# Altium integrated library BS_Altium_Lib.IntLib: 1016 symbols (part 7 of 8) (continued)
## LQG15HS39NJ02D (continued)
FIXED IND 39NH 300MA 650 MOHM; Manufacturer: Murata Electronics North America; Manufacturer Part Number: LQG15HS39NJ02D; Type: Multilayer; Tolerance: ±5%; Shielding: Unshielded; DC Resistance (DCR): 650 mOhm Max; Q @ Freq: 8 @ 100MHz; Frequency - Self Resonant: 1.2GHz; Frequency - Test: 100MHz; Supplier 1: Digi-Key; RoHS: RoHS Compliant; Category: Inductors, Coils, Chokes; Stock 1: 53048; Pricing 1: 1=0.1, 10=0.064, 25=0.0576, 50=0.05, 100=0.0448, 250=0.0416, 500=0.0384, 750=0.03648, 1000=0.03328 (USD); Packaging: Cut Tape (CT); Part Status: Active; Material - Core: -; Inductance: 39nH; Current Rating: 300mA; Current - Saturation: -; Ratings: -; Operating Temperature: -55°C ~ 125°C; Mounting Type: Surface Mount; Supplier Device Package: 0402 (1005 Metric); Size / Dimension: 0.039" L x 0.020" W (1.00mm x 0.50mm); Height - Seated (Max): 0.022" (0.55mm); ComponentLink1URL: http://psearch.en.murata.com/inductor/product/LQG15HS39NJ02_.pdf; ComponentLink1Description: http://psearch.en.murata.com/inductor/product/LQG15HS39NJ02_.pdf; Supplier Part Number 1: 490-2630-1-ND
footprint L 0402 (1005) (Chip Capacitor, 2-Leads, Body 1.0x0.5mm, IPC Medium Density)
pins: 1, 2

## LQG15HS47NJ02D
designator L?, comment 47nH  Package / Case: 0402
FIXED IND 47NH 300MA 720 MOHM; Manufacturer: Murata Electronics North America; Manufacturer Part Number: LQG15HS47NJ02D; Type: Multilayer; Tolerance: ±5%; Shielding: Unshielded; DC Resistance (DCR): 720 mOhm Max; Q @ Freq: 8 @ 100MHz; Frequency - Self Resonant: 1GHz; Frequency - Test: 100MHz; Supplier 1: Digi-Key; RoHS: RoHS Compliant; Category: Inductors, Coils, Chokes; Stock 1: 32519; Pricing 1: 1=0.1, 10=0.064, 25=0.0576, 50=0.05, 100=0.0448, 250=0.0416, 500=0.0384, 750=0.03648, 1000=0.03328 (USD); Packaging: Cut Tape (CT); Part Status: Active; Material - Core: -; Inductance: 47nH; Current Rating: 300mA; Current - Saturation: -; Ratings: -; Operating Temperature: -55°C ~ 125°C; Mounting Type: Surface Mount; Supplier Device Package: 0402 (1005 Metric); Size / Dimension: 0.039" L x 0.020" W (1.00mm x 0.50mm); Height - Seated (Max): 0.022" (0.55mm); ComponentLink1URL: http://psearch.en.murata.com/inductor/product/LQG15HS47NJ02_.pdf; ComponentLink1Description: http://psearch.en.murata.com/inductor/product/LQG15HS47NJ02_.pdf; Supplier Part Number 1: 490-2631-1-ND
footprint L 0402 (1005) (Chip Capacitor, 2-Leads, Body 1.0x0.5mm, IPC Medium Density)
pins: 1, 2

## LQG15HS56NJ02D
designator L?, comment 56nH  Package / Case: 0402
FIXED IND 56NH 250MA 820 MOHM; Manufacturer: Murata Electronics North America; Manufacturer Part Number: LQG15HS56NJ02D; Type: Multilayer; Tolerance: ±5%; Shielding: Unshielded; DC Resistance (DCR): 820 mOhm Max; Q @ Freq: 8 @ 100MHz; Frequency - Self Resonant: 800MHz; Frequency - Test: 100MHz; Supplier 1: Digi-Key; RoHS: RoHS Compliant; Category: Inductors, Coils, Chokes; Stock 1: 19955; Pricing 1: 1=0.1, 10=0.064, 25=0.0576, 50=0.05, 100=0.0448, 250=0.0416, 500=0.0384, 750=0.03648, 1000=0.03328 (USD); Packaging: Cut Tape (CT); Part Status: Active; Material - Core: -; Inductance: 56nH; Current Rating: 250mA; Current - Saturation: -; Ratings: -; Operating Temperature: -55°C ~ 125°C; Mounting Type: Surface Mount; Supplier Device Package: 0402 (1005 Metric); Size / Dimension: 0.039" L x 0.020" W (1.00mm x 0.50mm); Height - Seated (Max): 0.022" (0.55mm); ComponentLink1URL: http://psearch.en.murata.com/inductor/product/LQG15HS56NJ02_.pdf; ComponentLink1Description: http://psearch.en.murata.com/inductor/product/LQG15HS56NJ02_.pdf; Supplier Part Number 1: 490-2632-1-ND
footprint L 0402 (1005) (Chip Capacitor, 2-Leads, Body 1.0x0.5mm, IPC Medium Density)
pins: 1, 2

## LQG15HS68NJ02D
designator L?, comment 68nH  Package / Case: 0402
FIXED IND 68NH 250MA 920 MOHM; Manufacturer: Murata Electronics North America; Manufacturer Part Number: LQG15HS68NJ02D; Type: Multilayer; Tolerance: ±5%; Shielding: Unshielded; DC Resistance (DCR): 920 mOhm Max; Q @ Freq: 8 @ 100MHz; Frequency - Self Resonant: 800MHz; Frequency - Test: 100MHz; Supplier 1: Digi-Key; RoHS: RoHS Compliant; Category: Inductors, Coils, Chokes; Stock 1: 24528; Pricing 1: 1=0.1, 10=0.064, 25=0.0576, 50=0.05, 100=0.0448, 250=0.0416, 500=0.0384, 750=0.03648, 1000=0.03328 (USD); Packaging: Cut Tape (CT); Part Status: Active; Material - Core: -; Inductance: 68nH; Current Rating: 250mA; Current - Saturation: -; Ratings: -; Operating Temperature: -55°C ~ 125°C; Mounting Type: Surface Mount; Supplier Device Package: 0402 (1005 Metric); Size / Dimension: 0.039" L x 0.020" W (1.00mm x 0.50mm); Height - Seated (Max): 0.022" (0.55mm); ComponentLink1URL: http://psearch.en.murata.com/inductor/product/LQG15HS68NJ02_.pdf; ComponentLink1Description: http://psearch.en.murata.com/inductor/product/LQG15HS68NJ02_.pdf; Supplier Part Number 1: 490-2633-1-ND
footprint L 0402 (1005) (Chip Capacitor, 2-Leads, Body 1.0x0.5mm, IPC Medium Density)
pins: 1, 2

## LQG15HS82NJ02D
designator L?, comment 82nH  Package / Case: 0402
FIXED IND 82NH 200MA 1.2 OHM SMD; Manufacturer: Murata Electronics North America; Manufacturer Part Number: LQG15HS82NJ02D; Type: Multilayer; Tolerance: ±5%; Shielding: Unshielded; DC Resistance (DCR): 1.2 Ohm Max; Q @ Freq: 8 @ 100MHz; Frequency - Self Resonant: 700MHz; Frequency - Test: 100MHz; Supplier 1: Digi-Key; RoHS: RoHS Compliant; Category: Inductors, Coils, Chokes; Stock 1: 21756; Pricing 1: 1=0.1, 10=0.069, 25=0.062, 50=0.0538, 100=0.0483, 250=0.04484, 500=0.0414, 750=0.03933, 1000=0.03588 (USD); Packaging: Cut Tape (CT); Part Status: Active; Material - Core: -; Inductance: 82nH; Current Rating: 200mA; Current - Saturation: -; Ratings: -; Operating Temperature: -55°C ~ 125°C; Mounting Type: Surface Mount; Supplier Device Package: 0402 (1005 Metric); Size / Dimension: 0.039" L x 0.020" W (1.00mm x 0.50mm); Height - Seated (Max): 0.022" (0.55mm); ComponentLink1URL: http://psearch.en.murata.com/inductor/product/LQG15HS82NJ02_.pdf; ComponentLink1Description: http://psearch.en.murata.com/inductor/product/LQG15HS82NJ02_.pdf; Supplier Part Number 1: 490-2634-1-ND
footprint L 0402 (1005) (Chip Capacitor, 2-Leads, Body 1.0x0.5mm, IPC Medium Density)
pins: 1, 2

## LQG15HSR10J02D
designator L?, comment 100nH  Package / Case: 0402
FIXED IND 100NH 200MA 1.25 OHM; Manufacturer: Murata Electronics North America; Manufacturer Part Number: LQG15HSR10J02D; Type: Multilayer; Tolerance: ±5%; Shielding: Unshielded; DC Resistance (DCR): 1.25 Ohm Max; Q @ Freq: 8 @ 100MHz; Frequency - Self Resonant: 600MHz; Frequency - Test: 100MHz; Supplier 1: Digi-Key; RoHS: RoHS Compliant; Category: Inductors, Coils, Chokes; Stock 1: 87967; Pricing 1: 1=0.1, 10=0.069, 25=0.062, 50=0.0538, 100=0.0483, 250=0.04484, 500=0.0414, 750=0.03933, 1000=0.03588 (USD); Packaging: Cut Tape (CT); Part Status: Active; Material - Core: -; Inductance: 100nH; Current Rating: 200mA; Current - Saturation: -; Ratings: -; Operating Temperature: -55°C ~ 125°C; Mounting Type: Surface Mount; Supplier Device Package: 0402 (1005 Metric); Size / Dimension: 0.039" L x 0.020" W (1.00mm x 0.50mm); Height - Seated (Max): 0.022" (0.55mm); ComponentLink1URL: http://psearch.en.murata.com/inductor/product/LQG15HSR10J02_.pdf; ComponentLink1Description: http://psearch.en.murata.com/inductor/product/LQG15HSR10J02_.pdf; Supplier Part Number 1: 490-2635-1-ND
footprint L 0402 (1005) (Chip Capacitor, 2-Leads, Body 1.0x0.5mm, IPC Medium Density)
pins: 1, 2

## LQG15HSR12J02D
designator L?, comment 120nH  Package / Case: 0402
FIXED IND 120NH 200MA 1.3 OHM; Manufacturer: Murata Electronics North America; Manufacturer Part Number: LQG15HSR12J02D; Type: Multilayer; Tolerance: ±5%; Shielding: Unshielded; DC Resistance (DCR): 1.3 Ohm Max; Q @ Freq: 8 @ 100MHz; Frequency - Self Resonant: 600MHz; Frequency - Test: 100MHz; Supplier 1: Digi-Key; RoHS: RoHS Compliant; Category: Inductors, Coils, Chokes; Stock 1: 20627; Pricing 1: 1=0.1, 10=0.069, 25=0.062, 50=0.0538, 100=0.0483, 250=0.04484, 500=0.0414, 750=0.03933, 1000=0.03588 (USD); Packaging: Cut Tape (CT); Part Status: Active; Material - Core: -; Inductance: 120nH; Current Rating: 200mA; Current - Saturation: -; Ratings: -; Operating Temperature: -55°C ~ 125°C; Mounting Type: Surface Mount; Supplier Device Package: 0402 (1005 Metric); Size / Dimension: 0.039" L x 0.020" W (1.00mm x 0.50mm); Height - Seated (Max): 0.022" (0.55mm); ComponentLink1URL: http://psearch.en.murata.com/inductor/product/LQG15HSR12J02_.pdf; ComponentLink1Description: http://psearch.en.murata.com/inductor/product/LQG15HSR12J02_.pdf; Supplier Part Number 1: 490-2636-1-ND
footprint L 0402 (1005) (Chip Capacitor, 2-Leads, Body 1.0x0.5mm, IPC Medium Density)
pins: 1, 2

## LQG15HSR15J02D
designator L?, comment 150nH  Package / Case: 0402
FIXED IND 150NH 150MA 2.99 OHM; Manufacturer: Murata Electronics North America; Manufacturer Part Number: LQG15HSR15J02D; Type: Multilayer; Tolerance: ±5%; Shielding: Unshielded; DC Resistance (DCR): 2.99 Ohm Max; Q @ Freq: 8 @ 100MHz; Frequency - Self Resonant: 550MHz; Frequency - Test: 100MHz; Supplier 1: Digi-Key; RoHS: RoHS Compliant; Category: Inductors, Coils, Chokes; Stock 1: 32667; Pricing 1: 1=0.1, 10=0.076, 25=0.068, 50=0.0588, 100=0.0529, 250=0.04908, 500=0.0453, 750=0.04304, 1000=0.03926 (USD); Packaging: Cut Tape (CT); Part Status: Active; Material - Core: -; Inductance: 150nH; Current Rating: 150mA; Current - Saturation: -; Ratings: -; Operating Temperature: -55°C ~ 125°C; Mounting Type: Surface Mount; Supplier Device Package: 0402 (1005 Metric); Size / Dimension: 0.039" L x 0.020" W (1.00mm x 0.50mm); Height - Seated (Max): 0.022" (0.55mm); ComponentLink1URL: http://psearch.en.murata.com/inductor/product/LQG15HSR15J02_.pdf; ComponentLink1Description: http://psearch.en.murata.com/inductor/product/LQG15HSR15J02_.pdf; Supplier Part Number 1: 490-2637-1-ND
footprint L 0402 (1005) (Chip Capacitor, 2-Leads, Body 1.0x0.5mm, IPC Medium Density)
pins: 1, 2

## LQG15HSR18J02D
designator L?, comment 180nH  Package / Case: 0402
FIXED IND 180NH 150MA 3.38 OHM; Manufacturer: Murata Electronics North America; Manufacturer Part Number: LQG15HSR18J02D; Type: Multilayer; Tolerance: ±5%; Shielding: Unshielded; DC Resistance (DCR): 3.38 Ohm Max; Q @ Freq: 8 @ 100MHz; Frequency - Self Resonant: 500MHz; Frequency - Test: 100MHz; Supplier 1: Digi-Key; RoHS: RoHS Compliant; Category: Inductors, Coils, Chokes; Stock 1: 5742; Pricing 1: 1=0.1, 10=0.076, 25=0.068, 50=0.0588, 100=0.0529, 250=0.04908, 500=0.0453, 750=0.04304, 1000=0.03926 (USD); Packaging: Cut Tape (CT); Part Status: Active; Material - Core: -; Inductance: 180nH; Current Rating: 150mA; Current - Saturation: -; Ratings: -; Operating Temperature: -55°C ~ 125°C; Mounting Type: Surface Mount; Supplier Device Package: 0402 (1005 Metric); Size / Dimension: 0.039" L x 0.020" W (1.00mm x 0.50mm); Height - Seated (Max): 0.022" (0.55mm); ComponentLink1URL: http://psearch.en.murata.com/inductor/product/LQG15HSR18J02_.pdf; ComponentLink1Description: http://psearch.en.murata.com/inductor/product/LQG15HSR18J02_.pdf; Supplier Part Number 1: 490-2638-1-ND
footprint L 0402 (1005) (Chip Capacitor, 2-Leads, Body 1.0x0.5mm, IPC Medium Density)
pins: 1, 2

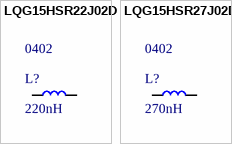
[diagram p46: symbols LQG15HSR22J02D to LQG15HSR27J02D]

## LQG15HSR22J02D
designator L?, comment 220nH  Package / Case: 0402
FIXED IND 220NH 120MA 3.77 OHM; Manufacturer: Murata Electronics North America; Manufacturer Part Number: LQG15HSR22J02D; Type: Multilayer; Tolerance: ±5%; Shielding: Unshielded; DC Resistance (DCR): 3.77 Ohm Max; Q @ Freq: 8 @ 100MHz; Frequency - Self Resonant: 450MHz; Frequency - Test: 100MHz; Supplier 1: Digi-Key; RoHS: RoHS Compliant; Category: Inductors, Coils, Chokes; Stock 1: 53052; Pricing 1: 1=0.1, 10=0.076, 25=0.068, 50=0.0588, 100=0.0529, 250=0.04908, 500=0.0453, 750=0.04304, 1000=0.03926 (USD); Packaging: Cut Tape (CT); Part Status: Active; Material - Core: -; Inductance: 220nH; Current Rating: 120mA; Current - Saturation: -; Ratings: -; Operating Temperature: -55°C ~ 125°C; Mounting Type: Surface Mount; Supplier Device Package: 0402 (1005 Metric); Size / Dimension: 0.039" L x 0.020" W (1.00mm x 0.50mm); Height - Seated (Max): 0.022" (0.55mm); ComponentLink1URL: http://psearch.en.murata.com/inductor/product/LQG15HSR22J02_.pdf; ComponentLink1Description: http://psearch.en.murata.com/inductor/product/LQG15HSR22J02_.pdf; Supplier Part Number 1: 490-2639-1-ND
footprint L 0402 (1005) (Chip Capacitor, 2-Leads, Body 1.0x0.5mm, IPC Medium Density)
pins: 1, 2

## LQG15HSR27J02D
designator L?, comment 270nH  Package / Case: 0402
FIXED IND 270NH 110MA 4.94 OHM; Manufacturer: Murata Electronics North America; Manufacturer Part Number: LQG15HSR27J02D; Type: Multilayer; Tolerance: ±5%; Shielding: Unshielded; DC Resistance (DCR): 4.94 Ohm Max; Q @ Freq: 8 @ 100MHz; Frequency - Self Resonant: 400MHz; Frequency - Test: 100MHz; Supplier 1: Digi-Key; RoHS: RoHS Compliant; Category: Inductors, Coils, Chokes; Stock 1: 51179; Pricing 1: 1=0.1, 10=0.076, 25=0.068, 50=0.0588, 100=0.0529, 250=0.04908, 500=0.0453, 750=0.04304, 1000=0.03926 (USD); Packaging: Cut Tape (CT); Part Status: Active; Material - Core: -; Inductance: 270nH; Current Rating: 110mA; Current - Saturation: -; Ratings: -; Operating Temperature: -55°C ~ 125°C; Mounting Type: Surface Mount; Supplier Device Package: 0402 (1005 Metric); Size / Dimension: 0.039" L x 0.020" W (1.00mm x 0.50mm); Height - Seated (Max): 0.022" (0.55mm); ComponentLink1URL: http://psearch.en.murata.com/inductor/product/LQG15HSR27J02_.pdf; ComponentLink1Description: http://psearch.en.murata.com/inductor/product/LQG15HSR27J02_.pdf; Supplier Part Number 1: 490-2640-1-ND
footprint L 0402 (1005) (Chip Capacitor, 2-Leads, Body 1.0x0.5mm, IPC Medium Density)
pins: 1, 2


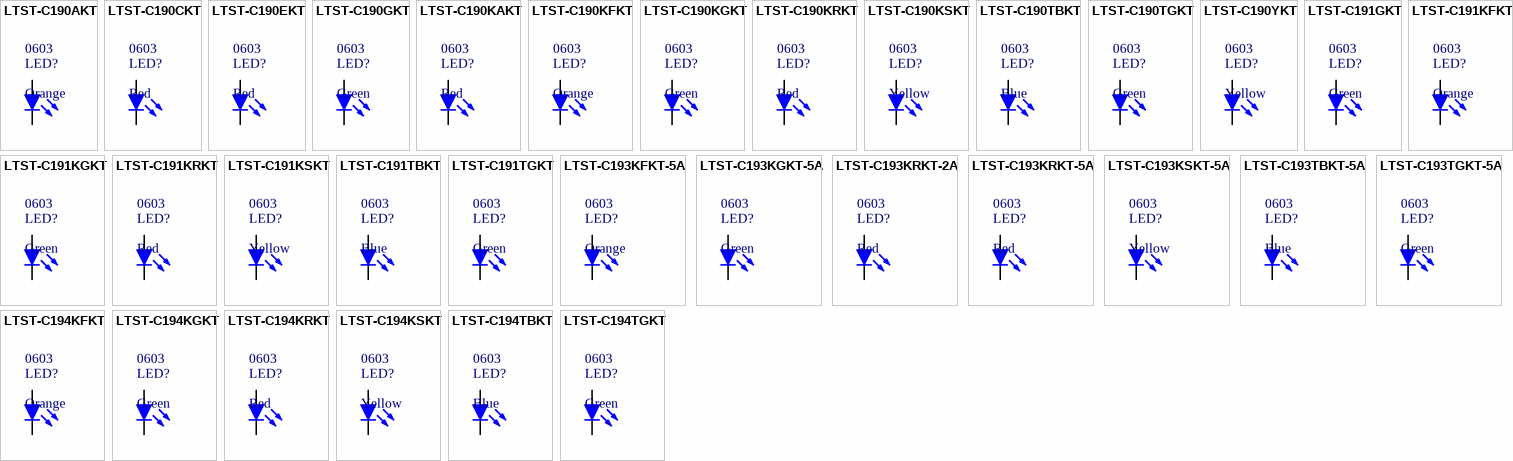
[diagram p47: symbols LTST-C190AKT to LTST-C194TGKT]

## LTST-C190AKT
designator LED?, comment Orange  Package: 0603
LED ORANGE CLEAR 0603 SMD; Manufacturer: Lite-On Inc.; Manufacturer Part Number: LTST-C190AKT; Lens Color: Colorless; Millicandela Rating: 2mcd; Lens Style/Size: Rectangle with Flat Top, 1.10mm x 0.80mm; Voltage - Forward (Vf) (Typ): 2.1V; Current - Test: 10mA; Viewing Angle: 130°; Wavelength - Dominant: 602nm; Wavelength - Peak: 610nm; Supplier 1: Digi-Key; Supplier Part Number 1: 160-1180-1-ND; RoHS: RoHS Compliant; Category: Optoelectronics; Stock 1: 66792; Pricing 1: 1=0.29, 10=0.211, 25=0.1556, 100=0.1111, 250=0.07556, 500=0.06666, 1000=0.05222 (USD); Packaging: Cut Tape (CT); Part Status: Active; Color: Orange; Lens Transparency: Clear; Mounting Type: Surface Mount; Features: -; Supplier Device Package: -; Size / Dimension: 1.60mm L x 0.80mm W; Height (Max): 0.80mm; ComponentLink1URL: http://media.digikey.com/pdf/Data%20Sheets/Lite-On%20PDFs/LTST-C190AKT.pdf; ComponentLink1Description: http://media.digikey.com/pdf/Data%20Sheets/Lite-On%20PDFs/LTST-C190AKT.pdf
footprint Led 0603 - orange (Led SMD 0603)
pins: 1 A, 2 K

## LTST-C190CKT
designator LED?, comment Red  Package: 0603
LED RED CLEAR 0603 SMD; Manufacturer: Lite-On Inc.; Manufacturer Part Number: LTST-C190CKT; Lens Color: Colorless; Millicandela Rating: 10mcd; Lens Style/Size: Rectangle with Flat Top, 1.10mm x 0.80mm; Voltage - Forward (Vf) (Typ): 1.8V; Current - Test: 10mA; Viewing Angle: 130°; Wavelength - Dominant: 638nm; Wavelength - Peak: 660nm; Supplier 1: Digi-Key; Supplier Part Number 1: 160-1181-1-ND; RoHS: RoHS Compliant; Category: Optoelectronics; Stock 1: 897957; Pricing 1: 1=0.33, 10=0.239, 25=0.1764, 100=0.126, 250=0.08564, 500=0.07558, 1000=0.0592 (USD); Packaging: Cut Tape (CT); Part Status: Active; Color: Red; Lens Transparency: Clear; Mounting Type: Surface Mount; Features: -; Supplier Device Package: -; Size / Dimension: 1.60mm L x 0.80mm W; Height (Max): 0.80mm; ComponentLink1URL: http://media.digikey.com/pdf/Data%20Sheets/Lite-On%20PDFs/LTST-C190CKT.pdf; ComponentLink1Description: http://media.digikey.com/pdf/Data%20Sheets/Lite-On%20PDFs/LTST-C190CKT.pdf
footprint Led 0603 - red (Led SMD 0603)
pins: 1 A, 2 K

## LTST-C190EKT
designator LED?, comment Red  Package: 0603
LED RED CLEAR 0603 SMD; Manufacturer: Lite-On Inc.; Manufacturer Part Number: LTST-C190EKT; Lens Color: Colorless; Millicandela Rating: 2mcd; Lens Style/Size: Rectangle with Flat Top, 1.10mm x 0.80mm; Voltage - Forward (Vf) (Typ): 2V; Current - Test: 10mA; Viewing Angle: 130°; Wavelength - Dominant: 621nm; Wavelength - Peak: 630nm; Supplier 1: Digi-Key; Supplier Part Number 1: 160-1182-1-ND; RoHS: RoHS Compliant; Category: Optoelectronics; Stock 1: 73458; Pricing 1: 1=0.29, 10=0.211, 25=0.1556, 100=0.1111, 250=0.07556, 500=0.06666, 1000=0.05222 (USD); Packaging: Cut Tape (CT); Part Status: Active; Color: Red; Lens Transparency: Clear; Mounting Type: Surface Mount; Features: -; Supplier Device Package: -; Size / Dimension: 1.60mm L x 0.80mm W; Height (Max): 0.80mm; ComponentLink1URL: http://media.digikey.com/pdf/Data%20Sheets/Lite-On%20PDFs/LTST-C190EKT.pdf; ComponentLink1Description: http://media.digikey.com/pdf/Data%20Sheets/Lite-On%20PDFs/LTST-C190EKT.pdf
footprint Led 0603 - red (Led SMD 0603)
pins: 1 A, 2 K

## LTST-C190GKT
designator LED?, comment Green  Package: 0603
LED GREEN CLEAR 0603 SMD; Manufacturer: Lite-On Inc.; Manufacturer Part Number: LTST-C190GKT; Lens Color: Colorless; Millicandela Rating: 6mcd; Lens Style/Size: Rectangle with Flat Top, 1.10mm x 0.80mm; Voltage - Forward (Vf) (Typ): 2.1V; Current - Test: 10mA; Viewing Angle: 130°; Wavelength - Dominant: 569nm; Wavelength - Peak: 565nm; Supplier 1: Digi-Key; Supplier Part Number 1: 160-1183-1-ND; RoHS: RoHS Compliant; Category: Optoelectronics; Stock 1: 775799; Pricing 1: 1=0.27, 10=0.196, 25=0.1448, 100=0.1034, 250=0.07032, 500=0.06204, 1000=0.0486 (USD); Packaging: Cut Tape (CT); Part Status: Active; Color: Green; Lens Transparency: Clear; Mounting Type: Surface Mount; Features: -; Supplier Device Package: -; Size / Dimension: 1.60mm L x 0.80mm W; Height (Max): 0.80mm; ComponentLink1URL: http://media.digikey.com/pdf/Data%20Sheets/Lite-On%20PDFs/LTST-C190GKT.pdf; ComponentLink1Description: http://media.digikey.com/pdf/Data%20Sheets/Lite-On%20PDFs/LTST-C190GKT.pdf
footprint Led 0603 - green (Led SMD 0603)
pins: 1 A, 2 K

## LTST-C190KAKT
designator LED?, comment Red  Package: 0603
LED RED CLEAR 0603 SMD; Manufacturer: Lite-On Inc.; Manufacturer Part Number: LTST-C190KAKT; Lens Color: Colorless; Millicandela Rating: 80mcd; Lens Style/Size: Rectangle with Flat Top, 1.06mm x 0.80mm; Voltage - Forward (Vf) (Typ): 2V; Current - Test: 20mA; Viewing Angle: 130°; Wavelength - Dominant: 615nm; Wavelength - Peak: 621nm; Supplier 1: Digi-Key; Supplier Part Number 1: 160-1433-1-ND; RoHS: RoHS Compliant; Category: Optoelectronics; Stock 1: 46405; Pricing 1: 1=0.41, 10=0.296, 25=0.2268, 100=0.148, 250=0.10852, 500=0.0921, 1000=0.07565 (USD); Packaging: Cut Tape (CT); Part Status: Active; Color: Red; Lens Transparency: Clear; Mounting Type: Surface Mount; Features: -; Supplier Device Package: Chip LED; Size / Dimension: 1.60mm L x 0.80mm W; Height (Max): 0.80mm; ComponentLink1URL: http://media.digikey.com/pdf/Data%20Sheets/Lite-On%20PDFs/LTST-C150,170,190KxKT.pdf; ComponentLink1Description: http://media.digikey.com/pdf/Data%20Sheets/Lite-On%20PDFs/LTST-C150,170,190KxKT.pdf
footprint Led 0603 - red (Led SMD 0603)
pins: 1 A, 2 K

## LTST-C190KFKT
designator LED?, comment Orange  Package: 0603
LED ORANGE CLEAR 0603 SMD; Manufacturer: Lite-On Inc.; Manufacturer Part Number: LTST-C190KFKT; Lens Color: Colorless; Millicandela Rating: 90mcd; Lens Style/Size: Rectangle with Flat Top, 1.10mm x 0.80mm; Voltage - Forward (Vf) (Typ): 2V; Current - Test: 20mA; Viewing Angle: 130°; Wavelength - Dominant: 605nm; Wavelength - Peak: 611nm; Supplier 1: Digi-Key; Supplier Part Number 1: 160-1434-1-ND; RoHS: RoHS Compliant; Category: Optoelectronics; Stock 1: 140692; Pricing 1: 1=0.25, 10=0.183, 25=0.1348, 100=0.0963, 250=0.06544, 500=0.05776, 1000=0.04524 (USD); Packaging: Cut Tape (CT); Part Status: Active; Color: Orange; Lens Transparency: Clear; Mounting Type: Surface Mount; Features: -; Size / Dimension: 1.60mm L x 0.80mm W; Height (Max): 0.80mm; ComponentLink1URL: http://optoelectronics.liteon.com/upload/download/DS-22-99-0186/S_110_LTST-C190KFKT.pdf; ComponentLink1Description: http://optoelectronics.liteon.com/upload/download/DS-22-99-0186/S_110_LTST-C190KFKT.pdf
footprint Led 0603 - orange (Led SMD 0603)
pins: 1 A, 2 K

## LTST-C190KGKT
designator LED?, comment Green  Package: 0603
LED GREEN CLEAR 0603 SMD; Manufacturer: Lite-On Inc.; Manufacturer Part Number: LTST-C190KGKT; Lens Color: Colorless; Millicandela Rating: 35mcd; Lens Style/Size: Rectangle with Flat Top, 1.10mm x 0.80mm; Voltage - Forward (Vf) (Typ): 2V; Current - Test: 20mA; Viewing Angle: 130°; Wavelength - Dominant: 571nm; Wavelength - Peak: 574nm; Supplier 1: Digi-Key; Supplier Part Number 1: 160-1435-1-ND; RoHS: RoHS Compliant; Category: Optoelectronics; Stock 1: 1137633; Pricing 1: 1=0.27, 10=0.196, 25=0.1448, 100=0.1034, 250=0.07032, 500=0.06204, 1000=0.0486 (USD); Packaging: Cut Tape (CT); Part Status: Active; Color: Green; Lens Transparency: Clear; Mounting Type: Surface Mount; Features: -; Size / Dimension: 1.60mm L x 0.80mm W; Height (Max): 0.80mm; ComponentLink1URL: http://optoelectronics.liteon.com/upload/download/DS22-2000-074/S_110_LTST-C190KGKT.pdf; ComponentLink1Description: http://optoelectronics.liteon.com/upload/download/DS22-2000-074/S_110_LTST-C190KGKT.pdf
footprint Led 0603 - green (Led SMD 0603)
pins: 1 A, 2 K

## LTST-C190KRKT
designator LED?, comment Red  Package: 0603
LED RED CLEAR 0603 SMD; Manufacturer: Lite-On Inc.; Manufacturer Part Number: LTST-C190KRKT; Lens Color: Colorless; Millicandela Rating: 99mcd; Lens Style/Size: Rectangle with Flat Top, 1.10mm x 0.80mm; Voltage - Forward (Vf) (Typ): 2V; Current - Test: 20mA; Viewing Angle: 130°; Wavelength - Dominant: 631nm; Wavelength - Peak: 639nm; Supplier 1: Digi-Key; Supplier Part Number 1: 160-1436-1-ND; RoHS: RoHS Compliant; Category: Optoelectronics; Stock 1: 498710; Pricing 1: 1=0.27, 10=0.196, 25=0.1448, 100=0.1034, 250=0.07032, 500=0.06204, 1000=0.0486 (USD); Packaging: Cut Tape (CT); Part Status: Active; Color: Red; Lens Transparency: Clear; Mounting Type: Surface Mount; Features: -; Size / Dimension: 1.60mm L x 0.80mm W; Height (Max): 0.80mm; ComponentLink1URL: http://optoelectronics.liteon.com/upload/download/DS-22-99-0151/S_110_LTST-C190KRKT.pdf; ComponentLink1Description: http://optoelectronics.liteon.com/upload/download/DS-22-99-0151/S_110_LTST-C190KRKT.pdf
footprint Led 0603 - red (Led SMD 0603)
pins: 1 A, 2 K

## LTST-C190KSKT
designator LED?, comment Yellow  Package: 0603
LED YELLOW CLEAR 0603 SMD; Manufacturer: Lite-On Inc.; Manufacturer Part Number: LTST-C190KSKT; Lens Color: Colorless; Millicandela Rating: 104mcd; Lens Style/Size: Rectangle with Flat Top, 1.10mm x 0.80mm; Voltage - Forward (Vf) (Typ): 2.1V; Current - Test: 20mA; Viewing Angle: 130°; Wavelength - Dominant: 591nm; Wavelength - Peak: 588nm; Supplier 1: Digi-Key; Supplier Part Number 1: 160-1437-1-ND; RoHS: RoHS Compliant; Category: Optoelectronics; Stock 1: 231453; Pricing 1: 1=0.29, 10=0.211, 25=0.1556, 100=0.1111, 250=0.07556, 500=0.06666, 1000=0.05222 (USD); Packaging: Cut Tape (CT); Part Status: Active; Color: Yellow; Lens Transparency: Clear; Mounting Type: Surface Mount; Features: -; Size / Dimension: 1.60mm L x 0.80mm W; Height (Max): 0.80mm; ComponentLink1URL: http://optoelectronics.liteon.com/upload/download/DS-22-99-0189/S_110_LTST-C190KSKT.pdf; ComponentLink1Description: http://optoelectronics.liteon.com/upload/download/DS-22-99-0189/S_110_LTST-C190KSKT.pdf
footprint Led 0603 - yellow (Led SMD 0603)
pins: 1 A, 2 K

## LTST-C190TBKT
designator LED?, comment Blue  Package: 0603
LED BLUE CLEAR 0603 SMD; Manufacturer: Lite-On Inc.; Manufacturer Part Number: LTST-C190TBKT; Lens Color: Colorless; Millicandela Rating: 104mcd; Lens Style/Size: Rectangle with Flat Top, 1.10mm x 0.80mm; Voltage - Forward (Vf) (Typ): 3.3V; Current - Test: 20mA; Viewing Angle: 130°; Wavelength - Dominant: 470nm; Wavelength - Peak: 468nm; Supplier 1: Digi-Key; Supplier Part Number 1: 160-1646-1-ND; RoHS: RoHS Compliant; Category: Optoelectronics; Stock 1: 280970; Pricing 1: 1=0.54, 10=0.392, 25=0.3004, 100=0.196, 250=0.14376, 500=0.12196, 1000=0.10019 (USD); Packaging: Cut Tape (CT); Part Status: Active; Lens Transparency: Clear; Mounting Type: Surface Mount; Features: -; Supplier Device Package: Chip LED; Size / Dimension: 1.60mm L x 0.80mm W; Height (Max): 0.90mm; ComponentLink1URL: http://optoelectronics.liteon.com/upload/download/DS-22-99-0224/S_110_LTST-C190TBKT(0630).pdf; ComponentLink1Description: http://optoelectronics.liteon.com/upload/download/DS-22-99-0224/S_110_LTST-C190TBKT(0630).pdf; Color: Blue
footprint Led 0603 - blue (Led SMD 0603)
pins: 1 A, 2 K

## LTST-C190TGKT
designator LED?, comment Green  Package: 0603
LED GREEN CLEAR 0603 SMD; Manufacturer: Lite-On Inc.; Manufacturer Part Number: LTST-C190TGKT; Lens Color: Colorless; Millicandela Rating: 260.5mcd; Lens Style/Size: Rectangle with Flat Top, 1.10mm x 0.80mm; Voltage - Forward (Vf) (Typ): 3.2V; Current - Test: 20mA; Viewing Angle: 130°; Wavelength - Dominant: 525nm; Wavelength - Peak: 530nm; Supplier 1: Digi-Key; Supplier Part Number 1: 160-2019-1-ND; RoHS: RoHS Compliant; Category: Optoelectronics; Stock 1: 21908; Pricing 1: 1=0.6, 10=0.436, 25=0.3556, 100=0.2844, 250=0.23996, 500=0.20442, 1000=0.15998 (USD); Packaging: Cut Tape (CT); Part Status: Active; Color: Green; Lens Transparency: Clear; Mounting Type: Surface Mount; Features: -; Supplier Device Package: -; Size / Dimension: 1.60mm L x 0.80mm W; Height (Max): 0.90mm; ComponentLink1URL: http://optoelectronics.liteon.com/upload/download/DS22-2000-032/S_110_LTST-C190TGKT.pdf; ComponentLink1Description: http://optoelectronics.liteon.com/upload/download/DS22-2000-032/S_110_LTST-C190TGKT.pdf
footprint Led 0603 - green (Led SMD 0603)
pins: 1 A, 2 K

## LTST-C190YKT
designator LED?, comment Yellow  Package: 0603
LED YELLOW CLEAR 0603 SMD; Manufacturer: Lite-On Inc.; Manufacturer Part Number: LTST-C190YKT; Lens Color: Colorless; Millicandela Rating: 6mcd; Lens Style/Size: Rectangle with Flat Top, 1.06mm x 0.80mm; Voltage - Forward (Vf) (Typ): 2.1V; Current - Test: 10mA; Viewing Angle: 130°; Wavelength - Dominant: 588nm; Wavelength - Peak: 585nm; Supplier 1: Digi-Key; Supplier Part Number 1: 160-1184-1-ND; RoHS: RoHS Compliant; Category: Optoelectronics; Stock 1: 70346; Pricing 1: 1=0.29, 10=0.211, 25=0.1556, 100=0.1111, 250=0.07556, 500=0.06666, 1000=0.05222 (USD); Packaging: Cut Tape (CT); Part Status: Active; Color: Yellow; Lens Transparency: Clear; Mounting Type: Surface Mount; Features: -; Supplier Device Package: -; Size / Dimension: 1.60mm L x 0.80mm W; Height (Max): 0.80mm; ComponentLink1URL: http://media.digikey.com/pdf/Data%20Sheets/Lite-On%20PDFs/LTST-C190YKT.pdf; ComponentLink1Description: http://media.digikey.com/pdf/Data%20Sheets/Lite-On%20PDFs/LTST-C190YKT.pdf
footprint Led 0603 - yellow (Led SMD 0603)
pins: 1 A, 2 K

## LTST-C191GKT
designator LED?, comment Green  Package: 0603
LED GREEN CLEAR 0603 SMD; Manufacturer: Lite-On Inc.; Manufacturer Part Number: LTST-C191GKT; Lens Color: Colorless; Millicandela Rating: 12mcd; Lens Style/Size: Rectangle with Flat Top, 1.10mm x 0.80mm; Voltage - Forward (Vf) (Typ): 2.1V; Current - Test: 20mA; Viewing Angle: 130°; Wavelength - Dominant: 569nm; Wavelength - Peak: 565nm; Supplier 1: Digi-Key; Supplier Part Number 1: 160-1443-1-ND; RoHS: RoHS Compliant; Category: Optoelectronics; Stock 1: 104656; Pricing 1: 1=0.35, 10=0.253, 25=0.1864, 100=0.1331, 250=0.09052, 500=0.07986, 1000=0.06256, 2500=0.06123 (USD); Packaging: Cut Tape (CT); Part Status: Active; Color: Green; Lens Transparency: Clear; Mounting Type: Surface Mount; Features: -; Supplier Device Package: Chip LED; Size / Dimension: 1.60mm L x 0.80mm W; Height (Max): 0.55mm; ComponentLink1URL: http://media.digikey.com/pdf/Data%20Sheets/Lite-On%20PDFs/LTST-C191GKT.pdf; ComponentLink1Description: http://media.digikey.com/pdf/Data%20Sheets/Lite-On%20PDFs/LTST-C191GKT.pdf
footprint Led 0603 - green (Led SMD 0603)
pins: 1 A, 2 K

## LTST-C191KFKT
designator LED?, comment Orange  Package: 0603
LED ORANGE CLEAR 0603 SMD; Manufacturer: Lite-On Inc.; Manufacturer Part Number: LTST-C191KFKT; Lens Color: Colorless; Millicandela Rating: 90mcd; Lens Style/Size: Rectangle with Flat Top, 1.10mm x 0.80mm; Voltage - Forward (Vf) (Typ): 2V; Current - Test: 20mA; Viewing Angle: 130°; Wavelength - Dominant: 605nm; Wavelength - Peak: 611nm; Supplier 1: Digi-Key; Supplier Part Number 1: 160-1445-1-ND; RoHS: RoHS Compliant; Category: Optoelectronics; Stock 1: 161318; Pricing 1: 1=0.27, 10=0.196, 25=0.1448, 100=0.1034, 250=0.07032, 500=0.06204, 1000=0.0486, 2500=0.04756 (USD); Packaging: Cut Tape (CT); Part Status: Active; Color: Orange; Lens Transparency: Clear; Mounting Type: Surface Mount; Features: -; Size / Dimension: 1.60mm L x 0.80mm W; Height (Max): 0.55mm; ComponentLink1URL: http://optoelectronics.liteon.com/upload/download/DS22-2000-222/S_110_LTST-C191KFKT.pdf; ComponentLink1Description: http://optoelectronics.liteon.com/upload/download/DS22-2000-222/S_110_LTST-C191KFKT.pdf
footprint Led 0603 - orange (Led SMD 0603)
pins: 1 A, 2 K

## LTST-C191KGKT
designator LED?, comment Green  Package: 0603
LED GREEN CLEAR 0603 SMD; Manufacturer: Lite-On Inc.; Manufacturer Part Number: LTST-C191KGKT; Lens Color: Colorless; Millicandela Rating: 35mcd; Lens Style/Size: Rectangle with Flat Top, 1.10mm x 0.80mm; Voltage - Forward (Vf) (Typ): 2V; Current - Test: 20mA; Viewing Angle: 130°; Wavelength - Dominant: 571nm; Wavelength - Peak: 574nm; Supplier 1: Digi-Key; Supplier Part Number 1: 160-1446-1-ND; RoHS: RoHS Compliant; Category: Optoelectronics; Stock 1: 1234324; Pricing 1: 1=0.29, 10=0.211, 25=0.1556, 100=0.1111, 250=0.07556, 500=0.06666, 1000=0.05222, 2500=0.05111 (USD); Packaging: Cut Tape (CT); Part Status: Active; Color: Green; Lens Transparency: Clear; Mounting Type: Surface Mount; Features: -; Size / Dimension: 1.60mm L x 0.80mm W; Height (Max): 0.55mm; ComponentLink1URL: http://optoelectronics.liteon.com/upload/download/DS22-2000-228/S_110_LTST-C191KGKT.pdf; ComponentLink1Description: http://optoelectronics.liteon.com/upload/download/DS22-2000-228/S_110_LTST-C191KGKT.pdf
footprint Led 0603 - green (Led SMD 0603)
pins: 1 A, 2 K

## LTST-C191KRKT
designator LED?, comment Red  Package: 0603
LED RED CLEAR 0603 SMD; Manufacturer: Lite-On Inc.; Manufacturer Part Number: LTST-C191KRKT; Lens Color: Colorless; Millicandela Rating: 54mcd; Lens Style/Size: Rectangle with Flat Top, 1.10mm x 0.80mm; Voltage - Forward (Vf) (Typ): 2V; Current - Test: 20mA; Viewing Angle: 130°; Wavelength - Dominant: 631nm; Wavelength - Peak: 639nm; Supplier 1: Digi-Key; Supplier Part Number 1: 160-1447-1-ND; RoHS: RoHS Compliant; Category: Optoelectronics; Stock 1: 549727; Pricing 1: 1=0.29, 10=0.211, 25=0.1556, 100=0.1111, 250=0.07556, 500=0.06666, 1000=0.05222, 2500=0.05111 (USD); Packaging: Cut Tape (CT); Part Status: Active; Color: Red; Lens Transparency: Clear; Mounting Type: Surface Mount; Features: -; Size / Dimension: 1.60mm L x 0.80mm W; Height (Max): 0.65mm; ComponentLink1URL: http://optoelectronics.liteon.com/upload/download/DS22-2000-223/S_110_LTST-C191KRKT.pdf; ComponentLink1Description: http://optoelectronics.liteon.com/upload/download/DS22-2000-223/S_110_LTST-C191KRKT.pdf
footprint Led 0603 - red (Led SMD 0603)
pins: 1 A, 2 K

## LTST-C191KSKT
designator LED?, comment Yellow  Package: 0603
LED YELLOW CLEAR 0603 SMD; Manufacturer: Lite-On Inc.; Manufacturer Part Number: LTST-C191KSKT; Lens Color: Colorless; Millicandela Rating: 104mcd; Lens Style/Size: Rectangle with Flat Top, 1.10mm x 0.80mm; Voltage - Forward (Vf) (Typ): 2.1V; Current - Test: 20mA; Viewing Angle: 130°; Wavelength - Dominant: 591nm; Wavelength - Peak: 588nm; Supplier 1: Digi-Key; Supplier Part Number 1: 160-1448-1-ND; RoHS: RoHS Compliant; Category: Optoelectronics; Stock 1: 519870; Pricing 1: 1=0.31, 10=0.225, 25=0.1656, 100=0.1183, 250=0.0804, 500=0.07096, 1000=0.05558, 2500=0.0544 (USD); Packaging: Cut Tape (CT); Part Status: Active; Color: Yellow; Lens Transparency: Clear; Mounting Type: Surface Mount; Features: -; Size / Dimension: 1.60mm L x 0.80mm W; Height (Max): 0.55mm; ComponentLink1URL: http://optoelectronics.liteon.com/upload/download/DS22-2000-224/S_110_LTST-C191KSKT.pdf; ComponentLink1Description: http://optoelectronics.liteon.com/upload/download/DS22-2000-224/S_110_LTST-C191KSKT.pdf
footprint Led 0603 - yellow (Led SMD 0603)
pins: 1 A, 2 K

## LTST-C191TBKT
designator LED?, comment Blue  Package: 0603
LED BLUE CLEAR 0603 SMD; Manufacturer: Lite-On Inc.; Manufacturer Part Number: LTST-C191TBKT; Lens Color: Colorless; Millicandela Rating: 104mcd; Lens Style/Size: Rectangle with Flat Top, 1.10mm x 0.80mm; Voltage - Forward (Vf) (Typ): 3.3V; Current - Test: 20mA; Viewing Angle: 130°; Wavelength - Dominant: 470nm; Wavelength - Peak: 468nm; Supplier 1: Digi-Key; Supplier Part Number 1: 160-1647-1-ND; RoHS: RoHS Compliant; Category: Optoelectronics; Stock 1: 573; Pricing 1: 1=0.52, 10=0.376, 25=0.2884, 100=0.1881, 250=0.13796, 500=0.11704, 1000=0.09614, 2500=0.0836 (USD); Packaging: Cut Tape (CT); Part Status: Active; Color: Blue; Lens Transparency: Clear; Mounting Type: Surface Mount; Features: -; Supplier Device Package: Chip LED; Size / Dimension: 1.60mm L x 0.80mm W; Height (Max): 0.65mm; ComponentLink1URL: http://optoelectronics.liteon.com/upload/download/DS22-2000-230/S_110_LTST-C191TBKT.pdf; ComponentLink1Description: http://optoelectronics.liteon.com/upload/download/DS22-2000-230/S_110_LTST-C191TBKT.pdf
footprint Led 0603 - blue (Led SMD 0603)
pins: 1 A, 2 K

## LTST-C191TGKT
designator LED?, comment Green  Package: 0603
LED GREEN CLEAR 0603 SMD; Manufacturer: Lite-On Inc.; Manufacturer Part Number: LTST-C191TGKT; Lens Color: Colorless; Millicandela Rating: 260.5mcd; Lens Style/Size: Rectangle with Flat Top, 1.10mm x 0.80mm; Voltage - Forward (Vf) (Typ): 3.2V; Current - Test: 20mA; Viewing Angle: 130°; Wavelength - Dominant: 525nm; Wavelength - Peak: 530nm; Supplier 1: Digi-Key; Supplier Part Number 1: 160-1888-1-ND; RoHS: RoHS Compliant; Category: Optoelectronics; Stock 1: 67746; Pricing 1: 1=0.6, 10=0.436, 25=0.3556, 100=0.2844, 250=0.23996, 500=0.20442, 1000=0.15998, 2500=0.14665 (USD); Packaging: Cut Tape (CT); Part Status: Active; Color: Green; Lens Transparency: Clear; Mounting Type: Surface Mount; Features: -; Supplier Device Package: Chip LED; Size / Dimension: 1.60mm L x 0.80mm W; Height (Max): 0.65mm; ComponentLink1URL: http://optoelectronics.liteon.com/upload/download/DS22-2000-300/S_110_LTST-C191TGKT.pdf; ComponentLink1Description: http://optoelectronics.liteon.com/upload/download/DS22-2000-300/S_110_LTST-C191TGKT.pdf
footprint Led 0603 - green (Led SMD 0603)
pins: 1 A, 2 K

## LTST-C193KFKT-5A
designator LED?, comment Orange  Package: 0603
LED ORANGE CLEAR 0603 SMD; Manufacturer: Lite-On Inc.; Manufacturer Part Number: LTST-C193KFKT-5A; Lens Color: Colorless; Millicandela Rating: 28.1mcd; Lens Style/Size: Rectangle with Flat Top, 1.15mm x 0.80mm; Voltage - Forward (Vf) (Typ): 2V; Current - Test: 5mA; Viewing Angle: 130°; Wavelength - Dominant: 605nm; Wavelength - Peak: 611nm; Supplier 1: Digi-Key; Supplier Part Number 1: 160-1829-1-ND; RoHS: RoHS Compliant; Category: Optoelectronics; Stock 1: 21252; Pricing 1: 1=0.41, 10=0.296, 25=0.2268, 100=0.148, 250=0.10852, 500=0.0921, 1000=0.07565 (USD); Packaging: Cut Tape (CT); Part Status: Active; Color: Orange; Lens Transparency: Clear; Mounting Type: Surface Mount; Features: -; Supplier Device Package: Chip LED; Size / Dimension: 1.60mm L x 0.80mm W; Height (Max): 0.35mm; ComponentLink1URL: http://optoelectronics.liteon.com/upload/download/DS22-2005-086/S_110_LTST-C193KFKT-5A.pdf; ComponentLink1Description: http://optoelectronics.liteon.com/upload/download/DS22-2005-086/S_110_LTST-C193KFKT-5A.pdf
footprint Led 0603 - orange (Led SMD 0603)
pins: 1 A, 2 K